# Altium footprint library Footprints.PcbLib: 266 footprints (part 9 of 17)
Each footprint in its own frame and in the unit in brackets; x right, y up, seen from the top. Pads: shape width x height; smd on the part's side, far side on the other; paste and mask are expansions set on the pad; w line width, h text height; cw(c..) or ccw(c..) is an arc to the next point about the centre after c.
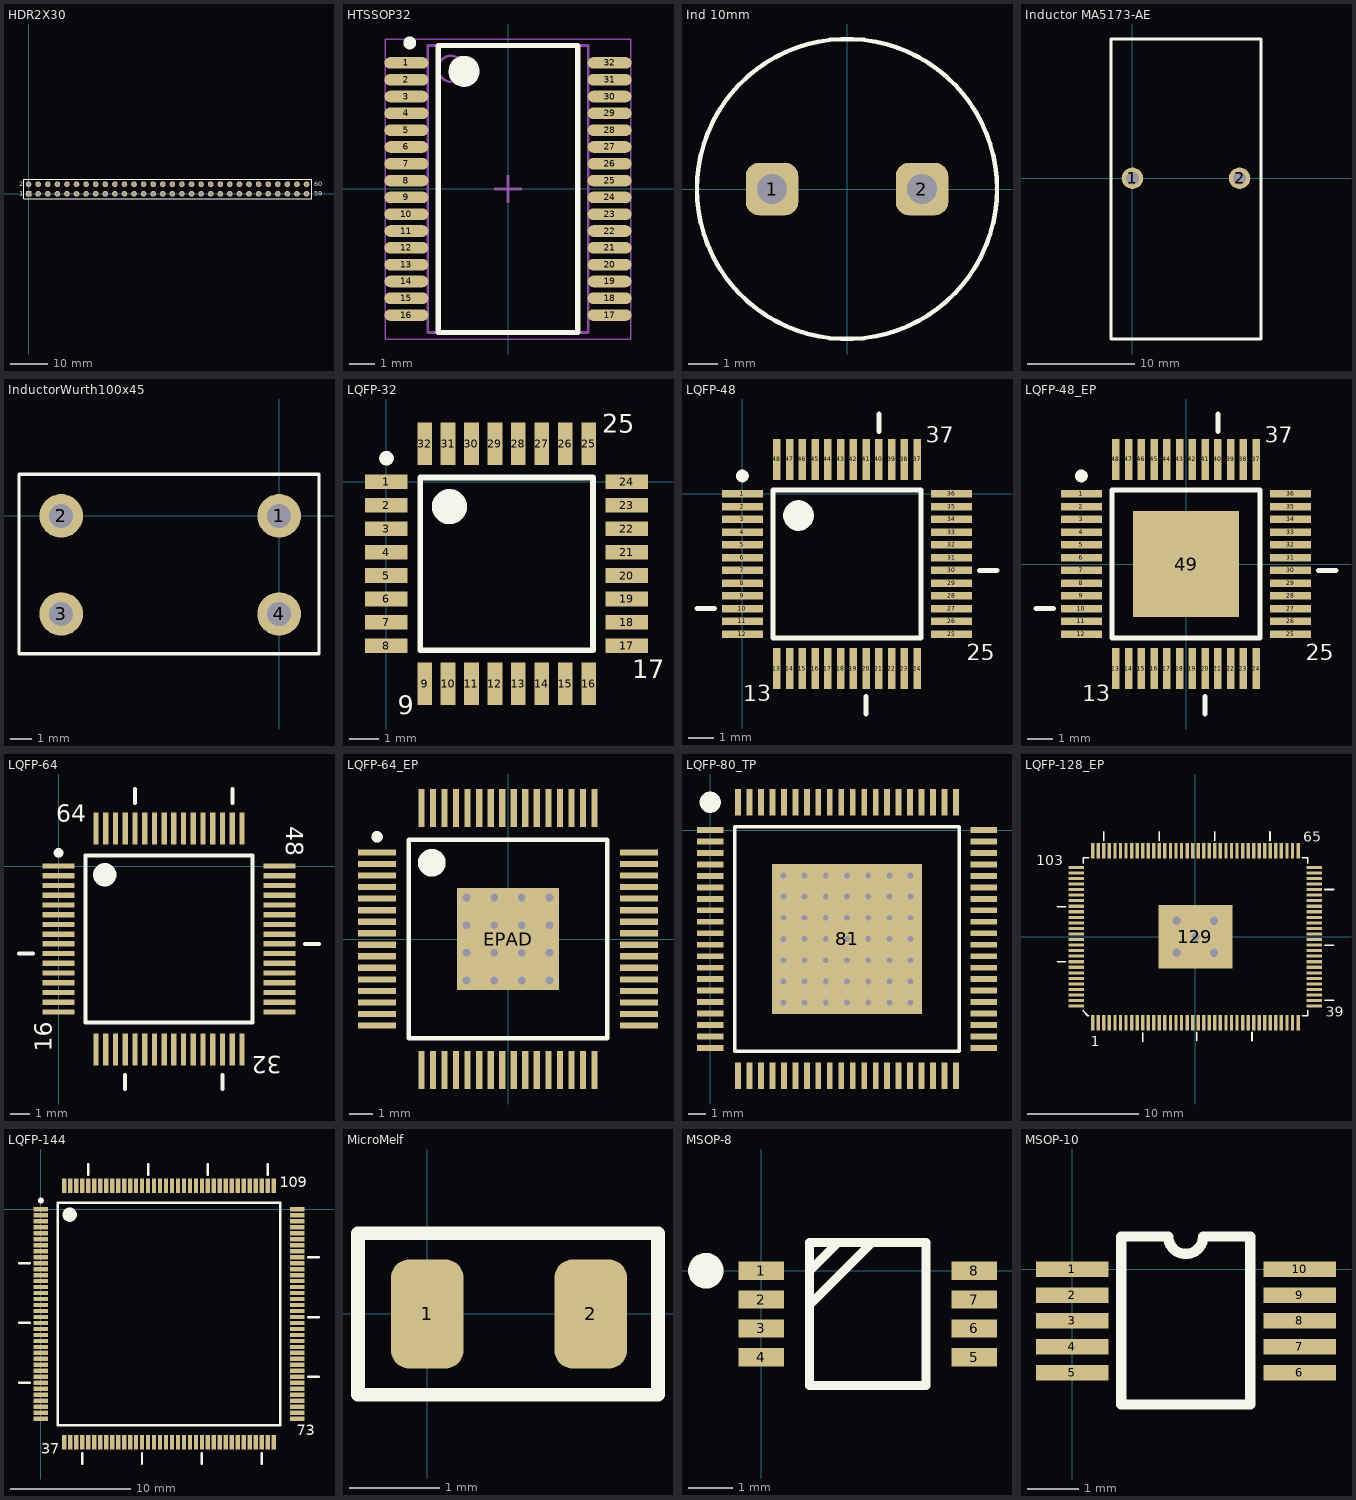
[diagram p8: the footprints below, top view; thin cyan lines are the x and y axes]

## HDR2X30 [mm] "Connector; Header; 30x2 Position"
pads (60):
  rect 1.5x1.5 hole 0.9: 1(0,0)
  round 1.5 hole 0.9: 2(0,2.54) 3(2.54,0) 4(2.54,2.54) 5(5.08,0) 6(5.08,2.54) 7(7.62,0) 8(7.62,2.54) 9(10.16,0) 10(10.16,2.54) 11(12.7,0) 12(12.7,2.54) 13(15.24,0) 14(15.24,2.54) 15(17.78,0) 16(17.78,2.54) 17(20.32,0) 18(20.32,2.54) 19(22.86,0) 20(22.86,2.54) 21(25.4,0) 22(25.4,2.54) 23(27.94,0) 24(27.94,2.54) 25(30.48,0) 26(30.48,2.54) 27(33.02,0) 28(33.02,2.54) 29(35.56,0) 30(35.56,2.54) 31(38.1,0) 32(38.1,2.54) 33(40.64,0) 34(40.64,2.54) 35(43.18,0) 36(43.18,2.54) 37(45.72,0) 38(45.72,2.54) 39(48.26,0) 40(48.26,2.54) 41(50.8,0) 42(50.8,2.54) 43(53.34,0) 44(53.34,2.54) 45(55.88,0) 46(55.88,2.54) 47(58.42,0) 48(58.42,2.54) 49(60.96,0) 50(60.96,2.54) 51(63.5,0) 52(63.5,2.54) 53(66.04,0) 54(66.04,2.54) 55(68.58,0) 56(68.58,2.54) 57(71.12,0) 58(71.12,2.54) 59(73.66,0) 60(73.66,2.54)
Top Overlay:
  lines w0.2: -1.27,-1.27 75.06,-1.27 75.06,3.81 -1.27,3.81 -1.27,-1.27
  text "60" at 75.692,2.032 h1.27
  text "59" at 75.692,-0.508 h1.27
  text "1" at -2.54,-0.508 h1.27
  text "2" at -2.54,2.032 h1.27
Bottom Overlay:
  text "1" at -55.88,-0.508 h1.27

## HTSSOP32 [mm] "TSOP, 32-Leads, Body 11,00x6,10mm, Pitch 0,65mm, IPC Medium Density"
height 1.1
pads (32):
  oval 1.7x0.45 smd: 1(-3.927,4.875) 2(-3.927,4.225) 3(-3.927,3.575) 4(-3.927,2.925) 5(-3.927,2.275) 6(-3.927,1.625) 7(-3.927,0.975) 8(-3.927,0.325) 9(-3.927,-0.325) 10(-3.927,-0.975) 11(-3.927,-1.625) 12(-3.927,-2.275) 13(-3.927,-2.925) 14(-3.927,-3.575) 15(-3.927,-4.225) 16(-3.927,-4.875) 17(3.927,-4.875) 18(3.927,-4.225) 19(3.927,-3.575) 20(3.927,-2.925) 21(3.927,-2.275) 22(3.927,-1.625) 23(3.927,-0.975) 24(3.927,-0.325) 25(3.927,0.325) 26(3.927,0.975) 27(3.927,1.625) 28(3.927,2.275) 29(3.927,2.925) 30(3.927,3.575) 31(3.927,4.225) 32(3.927,4.875)
Top Overlay:
  circle w0.6: c-1.7,4.55 r0.3
  circle w0.25: c-3.8,5.65 r0.125
  lines w0.2: -2.7,-5.55 2.7,-5.55 2.7,5.55 -2.7,5.55 -2.7,-5.55
Mechanical 13:
  circle w0.1: c-2.2,4.65 r0.5
  lines w0.1: -3.1,-5.55 3.1,-5.55 3.1,5.55 -3.1,5.55 -3.1,-5.55
Mechanical 15:
  lines w0.05: -4.75,-5.8 4.75,-5.8 4.75,5.8 -4.75,5.8 -4.75,-5.8
  lines w0.1: -0.5,0 0.5,0 ; 0,-0.5 0,0.5
3D body "HTSSOP32.step": height 1.08, standoff -0.02, extent -3.982,-5.599 4.236,5.501

## Ind 10mm [mil]
pads (2):
  rrect50% 70x70 hole 40: 1(-100,0) 2(100,0)
Top Overlay:
  circle w6: c0,0 r200
3D body "User Library-Inductor 10x12 (200 mils).STEP": height 477.56, standoff -152.36, extent -196.86,-191.54 196.84,202.16

## Inductor MA5173-AE [mm]
pads (2):
  round 2 hole 1.2: 1(0,0) 2(10,0)
Top Overlay:
  lines w0.254: -2,-2 -2,13 12,13 12,-15 -2,-15 -2,0
3D body "Coilcraft-MA5173-AE.STEP": height 28.6, standoff -12, extent -1.15,-14.3 11.15,14.3

## InductorWurth100x45 [mm]
pads (4):
  round 2 hole 1.1: 1(0,0) 2(-10,0) 3(-10,-4.5) 4(0,-4.5)
Top Overlay:
  lines w0.152: -11.938,-6.325 1.829,-6.325 1.829,1.905 -11.938,1.905 -11.938,-6.325
3D body "Download_STP_7448014501.stp": height 14.6, standoff -2.5, extent -11.555,-5.985 1.445,1.515

## LQFP-32 [mm] "TQFP, 32-Leads, Body 9,1x9,1mm (max), Pitch 0,80mm, IPC Medium Density"
height 1.6
pads (32):
  rect 1.45x0.5 smd: 1(0,0) 2(0,-0.8) 3(0,-1.6) 4(0,-2.4) 5(0,-3.2) 6(0,-4) 7(0,-4.8) 8(0,-5.6) 17(8.2,-5.6) 18(8.2,-4.8) 19(8.2,-4) 20(8.2,-3.2) 21(8.2,-2.4) 22(8.2,-1.6) 23(8.2,-0.8) 24(8.2,0)
  rect 0.5x1.45 smd: 9(1.3,-6.9) 10(2.1,-6.9) 11(2.9,-6.9) 12(3.7,-6.9) 13(4.5,-6.9) 14(5.3,-6.9) 15(6.1,-6.9) 16(6.9,-6.9) 25(6.9,1.3) 26(6.1,1.3) 27(5.3,1.3) 28(4.5,1.3) 29(3.7,1.3) 30(2.9,1.3) 31(2.1,1.3) 32(1.3,1.3)
Top Overlay:
  circle w0.25: c0,0.8 r0.125
  circle w0.6: c2.15,-0.85 r0.3
  lines w0.2: 1.15,-5.75 1.15,0.15 7.05,0.15 7.05,-5.75 1.15,-5.75
  text "9" at 0.381,-7.925 h0.64
  text "17" at 8.382,-6.706 h0.64
  text "25" at 7.366,1.676 h0.64
3D body "User Library-lqfp32-1.STEP": height 1.5, standoff 0.02, extent -0.406,-7.294 8.594,1.706

## LQFP-48 [mm] "LQFP, 48-Leads, Body 9,3x9,3mm (max), Pitch 0,50mm, IPC Medium Density"
height 1.4
pads (48):
  rect 1.6x0.3 smd: 1(0,0) 2(0,-0.5) 3(0,-1) 4(0,-1.5) 5(0,-2) 6(0,-2.5) 7(0,-3) 8(0,-3.5) 9(0,-4) 10(0,-4.5) 11(0,-5) 12(0,-5.5) 25(8.2,-5.5) 26(8.2,-5) 27(8.2,-4.5) 28(8.2,-4) 29(8.2,-3.5) 30(8.2,-3) 31(8.2,-2.5) 32(8.2,-2) 33(8.2,-1.5) 34(8.2,-1) 35(8.2,-0.5) 36(8.2,0)
  rect 0.3x1.6 smd: 13(1.35,-6.85) 14(1.85,-6.85) 15(2.35,-6.85) 16(2.85,-6.85) 17(3.35,-6.85) 18(3.85,-6.85) 19(4.35,-6.85) 20(4.85,-6.85) 21(5.35,-6.85) 22(5.85,-6.85) 23(6.35,-6.85) 24(6.85,-6.85) 37(6.85,1.35) 38(6.35,1.35) 39(5.85,1.35) 40(5.35,1.35) 41(4.85,1.35) 42(4.35,1.35) 43(3.85,1.35) 44(3.35,1.35) 45(2.85,1.35) 46(2.35,1.35) 47(1.85,1.35) 48(1.35,1.35)
Top Overlay:
  circle w0.6: c2.2,-0.85 r0.3
  circle w0.25: c0,0.7 r0.125
  lines w0.2: 1.2,-5.65 7,-5.65 7,0.15 1.2,0.15 1.2,-5.65
  lines w0.203: -1.778,-4.496 -1.092,-4.496 ; 4.846,-8.628 4.846,-7.942 ; 5.354,2.442 5.354,3.128 ; 9.292,-3.004 9.978,-3.004
  text "13" at 0.025,-8.128 h0.64
  text "25" at 8.788,-6.528 h0.64
  text "37" at 7.188,2.007 h0.64
3D body "SW3dPS-LQFP48.STEP": height 1.5, standoff 0, extent -0.389,-7.243 8.611,1.757

## LQFP-48_EP [mm] "LQFP, 48-Leads, Body 9,3x9,3mm (max), Pitch 0,50mm, IPC Medium Density"
height 1.4
pads (49):
  rect 1.6x0.3 smd: 1(-4.1,2.75) 2(-4.1,2.25) 3(-4.1,1.75) 4(-4.1,1.25) 5(-4.1,0.75) 6(-4.1,0.25) 7(-4.1,-0.25) 8(-4.1,-0.75) 9(-4.1,-1.25) 10(-4.1,-1.75) 11(-4.1,-2.25) 12(-4.1,-2.75) 25(4.1,-2.75) 26(4.1,-2.25) 27(4.1,-1.75) 28(4.1,-1.25) 29(4.1,-0.75) 30(4.1,-0.25) 31(4.1,0.25) 32(4.1,0.75) 33(4.1,1.25) 34(4.1,1.75) 35(4.1,2.25) 36(4.1,2.75)
  rect 0.3x1.6 smd: 13(-2.75,-4.1) 14(-2.25,-4.1) 15(-1.75,-4.1) 16(-1.25,-4.1) 17(-0.75,-4.1) 18(-0.25,-4.1) 19(0.25,-4.1) 20(0.75,-4.1) 21(1.25,-4.1) 22(1.75,-4.1) 23(2.25,-4.1) 24(2.75,-4.1) 37(2.75,4.1) 38(2.25,4.1) 39(1.75,4.1) 40(1.25,4.1) 41(0.75,4.1) 42(0.25,4.1) 43(-0.25,4.1) 44(-0.75,4.1) 45(-1.25,4.1) 46(-1.75,4.1) 47(-2.25,4.1) 48(-2.75,4.1)
  rect 4.15x4.15 smd paste-1000: 49(0,0)
Top Overlay:
  circle w0.25: c-4.1,3.45 r0.125
  lines w0.2: -2.9,-2.9 -2.9,2.9 2.9,2.9 2.9,-2.9 -2.9,-2.9
  lines w0.203: -5.878,-1.746 -5.192,-1.746 ; 0.746,-5.878 0.746,-5.192 ; 1.254,5.192 1.254,5.878 ; 5.192,-0.254 5.878,-0.254
  text "37" at 3.088,4.757 h0.64
  text "25" at 4.688,-3.778 h0.64
  text "13" at -4.075,-5.378 h0.64
Top Paste:
  circle w0.2: c-1.722,1.524 r0.1
  circle w0.2: c-1.037,1.524 r0.1
  circle w0.2: c-0.352,1.524 r0.1
  circle w0.2: c0.333,1.524 r0.1
  circle w0.2: c1.018,1.524 r0.1
  circle w0.2: c1.703,1.524 r0.1
  circle w0.2: c-1.722,0.925 r0.1
  circle w0.2: c-1.037,0.925 r0.1
  circle w0.2: c-0.352,0.925 r0.1
  circle w0.2: c0.333,0.925 r0.1
  circle w0.2: c1.018,0.925 r0.1
  circle w0.2: c1.703,0.925 r0.1
  circle w0.2: c-1.722,0.325 r0.1
  circle w0.2: c-1.037,0.325 r0.1
  circle w0.2: c-0.352,0.325 r0.1
  circle w0.2: c0.333,0.325 r0.1
  circle w0.2: c1.018,0.325 r0.1
  circle w0.2: c1.703,0.325 r0.1
  circle w0.2: c-1.722,-0.274 r0.1
  circle w0.2: c-1.037,-0.274 r0.1
  circle w0.2: c-0.352,-0.274 r0.1
  circle w0.2: c0.333,-0.274 r0.1
  circle w0.2: c1.018,-0.274 r0.1
  circle w0.2: c1.703,-0.274 r0.1
  circle w0.2: c1.703,-0.874 r0.1
  circle w0.2: c1.018,-0.874 r0.1
  circle w0.2: c0.333,-0.874 r0.1
  circle w0.2: c-0.352,-0.874 r0.1
  circle w0.2: c-1.037,-0.874 r0.1
  circle w0.2: c-1.722,-0.874 r0.1
  circle w0.2: c-1.722,-1.473 r0.1
  circle w0.2: c-1.037,-1.473 r0.1
  circle w0.2: c-0.352,-1.473 r0.1
  circle w0.2: c0.333,-1.473 r0.1
  circle w0.2: c1.018,-1.473 r0.1
  circle w0.2: c1.703,-1.473 r0.1
3D body "SW3dPS-LQFP48.STEP": height 1.5, standoff 0, extent -4.489,-4.493 4.511,4.507

## LQFP-64 [mm] "LQFP, 64-Leads, Body 12,2x12,2mm (max), Pitch 0,50mm, IPC Medium Density"
height 1.6
pads (64):
  rect 1.65x0.27 smd: 1(0,0) 2(0,-0.5) 3(0,-1) 4(0,-1.5) 5(0,-2) 6(0,-2.5) 7(0,-3) 8(0,-3.5) 9(0,-4) 10(0,-4.5) 11(0,-5) 12(0,-5.5) 13(0,-6) 14(0,-6.5) 15(0,-7) 16(0,-7.5) 33(11.35,-7.5) 34(11.35,-7) 35(11.35,-6.5) 36(11.35,-6) 37(11.35,-5.5) 38(11.35,-5) 39(11.35,-4.5) 40(11.35,-4) 41(11.35,-3.5) 42(11.35,-3) 43(11.35,-2.5) 44(11.35,-2) 45(11.35,-1.5) 46(11.35,-1) 47(11.35,-0.5) 48(11.35,0)
  rect 0.27x1.65 smd: 17(1.925,-9.425) 18(2.425,-9.425) 19(2.925,-9.425) 20(3.425,-9.425) 21(3.925,-9.425) 22(4.425,-9.425) 23(4.925,-9.425) 24(5.425,-9.425) 25(5.925,-9.425) 26(6.425,-9.425) 27(6.925,-9.425) 28(7.425,-9.425) 29(7.925,-9.425) 30(8.425,-9.425) 31(8.925,-9.425) 32(9.425,-9.425) 49(9.425,1.925) 50(8.925,1.925) 51(8.425,1.925) 52(7.925,1.925) 53(7.425,1.925) 54(6.925,1.925) 55(6.425,1.925) 56(5.925,1.925) 57(5.425,1.925) 58(4.925,1.925) 59(4.425,1.925) 60(3.925,1.925) 61(3.425,1.925) 62(2.925,1.925) 63(2.425,1.925) 64(1.925,1.925)
Top Overlay:
  circle w0.6: c2.375,-0.45 r0.3
  circle w0.25: c0,0.677 r0.125
  lines w0.2: 1.375,-8.05 9.975,-8.05 9.975,0.55 1.375,0.55 1.375,-8.05
  lines w0.203: -2.032,-4.496 -1.321,-4.496 ; 3.421,-11.457 3.421,-10.746 ; 3.929,3.246 3.929,3.957 ; 8.421,-11.457 8.421,-10.746 ; 8.929,3.246 8.929,3.957 ; 12.671,-4.004 13.382,-4.004
  text "64" at -0.127,2.286 h0.89
  text "48" at 11.711,2.052 h0.89
  text "32" at 11.477,-9.786 h0.89
  text "16" at -0.361,-9.552 h0.89
3D body "lqpf64.STEP": height 1.5, standoff 0.02, extent -0.325,-9.75 11.675,2.25

## LQFP-64_EP [mm] "LQFP, 64-Leads, Body 12,2x12,2mm (max), Pitch 0,50mm, IPC Medium Density"
height 1.6
pads (65):
  rect 1.65x0.27 smd: 1(-5.675,3.75) 2(-5.675,3.25) 3(-5.675,2.75) 4(-5.675,2.25) 5(-5.675,1.75) 6(-5.675,1.25) 7(-5.675,0.75) 8(-5.675,0.25) 9(-5.675,-0.25) 10(-5.675,-0.75) 11(-5.675,-1.25) 12(-5.675,-1.75) 13(-5.675,-2.25) 14(-5.675,-2.75) 15(-5.675,-3.25) 16(-5.675,-3.75) 33(5.675,-3.75) 34(5.675,-3.25) 35(5.675,-2.75) 36(5.675,-2.25) 37(5.675,-1.75) 38(5.675,-1.25) 39(5.675,-0.75) 40(5.675,-0.25) 41(5.675,0.25) 42(5.675,0.75) 43(5.675,1.25) 44(5.675,1.75) 45(5.675,2.25) 46(5.675,2.75) 47(5.675,3.25) 48(5.675,3.75)
  rect 0.27x1.65 smd: 17(-3.75,-5.675) 18(-3.25,-5.675) 19(-2.75,-5.675) 20(-2.25,-5.675) 21(-1.75,-5.675) 22(-1.25,-5.675) 23(-0.75,-5.675) 24(-0.25,-5.675) 25(0.25,-5.675) 26(0.75,-5.675) 27(1.25,-5.675) 28(1.75,-5.675) 29(2.25,-5.675) 30(2.75,-5.675) 31(3.25,-5.675) 32(3.75,-5.675) 49(3.75,5.675) 50(3.25,5.675) 51(2.75,5.675) 52(2.25,5.675) 53(1.75,5.675) 54(1.25,5.675) 55(0.75,5.675) 56(0.25,5.675) 57(-0.25,5.675) 58(-0.75,5.675) 59(-1.25,5.675) 60(-1.75,5.675) 61(-2.25,5.675) 62(-2.75,5.675) 63(-3.25,5.675) 64(-3.75,5.675)
  rect 4.4x4.4 smd paste-900: EPAD(0,0)
via 1.8,-1.8 diameter 0.66 hole 0.33
via 0.6,-1.8 diameter 0.66 hole 0.33
via -0.6,-1.8 diameter 0.66 hole 0.33
via -1.8,-1.8 diameter 0.66 hole 0.33
via 1.8,-0.6 diameter 0.66 hole 0.33
via 0.6,-0.6 diameter 0.66 hole 0.33
via -0.6,-0.6 diameter 0.66 hole 0.33
via -1.8,-0.6 diameter 0.66 hole 0.33
via 1.8,0.6 diameter 0.66 hole 0.33
via 0.6,0.6 diameter 0.66 hole 0.33
via -0.6,0.6 diameter 0.66 hole 0.33
via -1.8,0.6 diameter 0.66 hole 0.33
via 1.8,1.8 diameter 0.66 hole 0.33
via 0.6,1.8 diameter 0.66 hole 0.33
via -0.6,1.8 diameter 0.66 hole 0.33
via -1.8,1.8 diameter 0.66 hole 0.33
Top Overlay:
  circle w0.6: c-3.3,3.3 r0.3
  circle w0.25: c-5.675,4.427 r0.125
  lines w0.2: -4.3,-4.3 4.3,-4.3 4.3,4.3 -4.3,4.3 -4.3,-4.3
Top Paste:
  rectangle: -1.8,0.6 -0.6,1.8
  rectangle: -0.6,-0.6 0.6,0.6
  rectangle: 0.6,-1.8 1.8,-0.6
  rectangle: 0.6,0.6 1.8,1.8
  rectangle: -1.8,-1.8 -0.6,-0.6
3D body "lqpf64.STEP": height 1.5, standoff 0.02, extent -6,-6 6,6

## LQFP-80_TP [mm] "LQFP, 80-Leads, Body 16,3x16,3mm (max), Pitch 0,65mm, IPC Medium Density"
height 1.6
pads (81):
  rect 1.5x0.33 smd: 1(0,0) 2(0,-0.65) 3(0,-1.3) 4(0,-1.95) 5(0,-2.6) 6(0,-3.25) 7(0,-3.9) 8(0,-4.55) 9(0,-5.2) 10(0,-5.85) 11(0,-6.5) 12(0,-7.15) 13(0,-7.8) 14(0,-8.45) 15(0,-9.1) 16(0,-9.75) 17(0,-10.4) 18(0,-11.05) 19(0,-11.7) 20(0,-12.35) 41(15.5,-12.35) 42(15.5,-11.7) 43(15.5,-11.05) 44(15.5,-10.4) 45(15.5,-9.75) 46(15.5,-9.1) 47(15.5,-8.45) 48(15.5,-7.8) 49(15.5,-7.15) 50(15.5,-6.5) 51(15.5,-5.85) 52(15.5,-5.2) 53(15.5,-4.55) 54(15.5,-3.9) 55(15.5,-3.25) 56(15.5,-2.6) 57(15.5,-1.95) 58(15.5,-1.3) 59(15.5,-0.65) 60(15.5,0)
  rect 0.33x1.5 smd: 21(1.575,-13.925) 22(2.225,-13.925) 23(2.875,-13.925) 24(3.525,-13.925) 25(4.175,-13.925) 26(4.825,-13.925) 27(5.475,-13.925) 28(6.125,-13.925) 29(6.775,-13.925) 30(7.425,-13.925) 31(8.075,-13.925) 32(8.725,-13.925) 33(9.375,-13.925) 34(10.025,-13.925) 35(10.675,-13.925) 36(11.325,-13.925) 37(11.975,-13.925) 38(12.625,-13.925) 39(13.275,-13.925) 40(13.925,-13.925) 61(13.925,1.575) 62(13.275,1.575) 63(12.625,1.575) 64(11.975,1.575) 65(11.325,1.575) 66(10.675,1.575) 67(10.025,1.575) 68(9.375,1.575) 69(8.725,1.575) 70(8.075,1.575) 71(7.425,1.575) 72(6.775,1.575) 73(6.125,1.575) 74(5.475,1.575) 75(4.825,1.575) 76(4.175,1.575) 77(3.525,1.575) 78(2.875,1.575) 79(2.225,1.575) 80(1.575,1.575)
  rect 8.5x8.5 smd paste-100: 81(7.75,-6.175)
via 11.35,-9.775 diameter 0.66 hole 0.33
via 10.15,-9.775 diameter 0.66 hole 0.33
via 8.95,-9.775 diameter 0.66 hole 0.33
via 7.75,-9.775 diameter 0.66 hole 0.33
via 6.55,-9.775 diameter 0.66 hole 0.33
via 5.35,-9.775 diameter 0.66 hole 0.33
via 4.15,-9.775 diameter 0.66 hole 0.33
via 11.35,-8.575 diameter 0.66 hole 0.33
via 10.15,-8.575 diameter 0.66 hole 0.33
via 8.95,-8.575 diameter 0.66 hole 0.33
via 7.75,-8.575 diameter 0.66 hole 0.33
via 6.55,-8.575 diameter 0.66 hole 0.33
via 5.35,-8.575 diameter 0.66 hole 0.33
via 4.15,-8.575 diameter 0.66 hole 0.33
via 11.35,-7.375 diameter 0.66 hole 0.33
via 10.15,-7.375 diameter 0.66 hole 0.33
via 8.95,-7.375 diameter 0.66 hole 0.33
via 7.75,-7.375 diameter 0.66 hole 0.33
via 6.55,-7.375 diameter 0.66 hole 0.33
via 5.35,-7.375 diameter 0.66 hole 0.33
via 4.15,-7.375 diameter 0.66 hole 0.33
via 11.35,-6.175 diameter 0.66 hole 0.33
via 10.15,-6.175 diameter 0.66 hole 0.33
via 8.95,-6.175 diameter 0.66 hole 0.33
via 7.75,-6.175 diameter 0.66 hole 0.33
via 6.55,-6.175 diameter 0.66 hole 0.33
via 5.35,-6.175 diameter 0.66 hole 0.33
via 4.15,-6.175 diameter 0.66 hole 0.33
via 11.35,-4.975 diameter 0.66 hole 0.33
via 10.15,-4.975 diameter 0.66 hole 0.33
via 8.95,-4.975 diameter 0.66 hole 0.33
via 7.75,-4.975 diameter 0.66 hole 0.33
via 6.55,-4.975 diameter 0.66 hole 0.33
via 5.35,-4.975 diameter 0.66 hole 0.33
via 4.15,-4.975 diameter 0.66 hole 0.33
via 11.35,-3.775 diameter 0.66 hole 0.33
via 10.15,-3.775 diameter 0.66 hole 0.33
via 8.95,-3.775 diameter 0.66 hole 0.33
via 7.75,-3.775 diameter 0.66 hole 0.33
via 6.55,-3.775 diameter 0.66 hole 0.33
via 5.35,-3.775 diameter 0.66 hole 0.33
via 4.15,-3.775 diameter 0.66 hole 0.33
via 11.35,-2.575 diameter 0.66 hole 0.33
via 10.15,-2.575 diameter 0.66 hole 0.33
via 8.95,-2.575 diameter 0.66 hole 0.33
via 7.75,-2.575 diameter 0.66 hole 0.33
via 6.55,-2.575 diameter 0.66 hole 0.33
via 5.35,-2.575 diameter 0.66 hole 0.33
via 4.15,-2.575 diameter 0.66 hole 0.33
Top Overlay:
  circle w0.6: c0,1.575 r0.3
  lines w0.2: 1.4,-12.525 14.1,-12.525 14.1,0.175 1.4,0.175 1.4,-12.525
Top Paste:
  rectangle: 8.95,-9.775 11.35,-7.375
  rectangle: 4.15,-9.775 6.55,-7.375
  rectangle: 6.55,-7.375 8.95,-4.975
  rectangle: 8.95,-4.975 11.35,-2.575
  rectangle: 4.15,-4.975 6.55,-2.575
3D body "LQFP-80 14x14.STEP": height 1.6, standoff 0.01, extent -0.254,-14.177 15.755,1.832

## LQFP-128_EP [mil]
height 62.99
pads (129):
  rect 12x55 smd: 1(-364.5,-304.5) 2(-344.8,-304.5) 3(-325.1,-304.5) 4(-305.4,-304.5) 5(-285.7,-304.5) 6(-266,-304.5) 7(-246.3,-304.5) 8(-226.6,-304.5) 9(-206.9,-304.5) 10(-187.2,-304.5) 11(-167.5,-304.5) 12(-147.8,-304.5) 13(-128.1,-304.5) 14(-108.4,-304.5) 15(-88.7,-304.5) 16(-69,-304.5) 17(-49.3,-304.5) 18(-29.6,-304.5) 19(-9.9,-304.5) 20(9.8,-304.5) 21(29.5,-304.5) 22(49.2,-304.5) 23(68.9,-304.5) 24(88.6,-304.5) 25(108.3,-304.5) 26(128,-304.5) 27(147.7,-304.5) 28(167.4,-304.5) 29(187.1,-304.5) 30(206.8,-304.5) 31(226.5,-304.5) 32(246.2,-304.5) 33(265.9,-304.5) 34(285.6,-304.5) 35(305.3,-304.5) 36(325,-304.5) 37(344.7,-304.5) 38(364.4,-304.5) 65(364.4,304.5) 66(344.7,304.5) 67(325,304.5) 68(305.3,304.5) 69(285.6,304.5) 70(265.9,304.5) 71(246.2,304.5) 72(226.5,304.5) 73(206.8,304.5) 74(187.1,304.5) 75(167.4,304.5) 76(147.7,304.5) 77(128,304.5) 78(108.3,304.5) 79(88.6,304.5) 80(68.9,304.5) 81(49.2,304.5) 82(29.5,304.5) 83(9.8,304.5) 84(-9.9,304.5) 85(-29.6,304.5) 86(-49.3,304.5) 87(-69,304.5) 88(-88.7,304.5) 89(-108.4,304.5) 90(-128.1,304.5) 91(-147.8,304.5) 92(-167.5,304.5) 93(-187.2,304.5) 94(-206.9,304.5) 95(-226.6,304.5) 96(-246.3,304.5) 97(-266,304.5) 98(-285.7,304.5) 99(-305.4,304.5) 100(-325.1,304.5) 101(-344.8,304.5) 102(-364.5,304.5)
  rect 55x11 smd: 39(422.5,-246.3) 40(422.5,-226.6) 41(422.5,-206.9) 42(422.5,-187.2) 43(422.5,-167.5) 44(422.5,-147.8) 45(422.5,-128.1) 46(422.5,-108.4) 47(422.5,-88.7) 48(422.5,-69) 49(422.5,-49.3) 50(422.5,-29.6) 51(422.5,-9.9) 52(422.5,9.8) 53(422.5,29.5) 54(422.5,49.2) 55(422.5,68.9) 56(422.5,88.6) 57(422.5,108.3) 58(422.5,128) 59(422.5,147.7) 60(422.5,167.4) 61(422.5,187.1) 62(422.5,206.8) 63(422.5,226.5) 64(422.5,246.2) 103(-422.5,246.2) 104(-422.5,226.5) 105(-422.5,206.8) 106(-422.5,187.1) 107(-422.5,167.4) 108(-422.5,147.7) 109(-422.5,128) 110(-422.5,108.3) 111(-422.5,88.6) 112(-422.5,68.9) 113(-422.5,49.2) 114(-422.5,29.5) 115(-422.5,9.8) 116(-422.5,-9.9) 117(-422.5,-29.6) 118(-422.5,-49.3) 119(-422.5,-69) 120(-422.5,-88.7) 121(-422.5,-108.4) 122(-422.5,-128.1) 123(-422.5,-147.8) 124(-422.5,-167.5) 125(-422.5,-187.2) 126(-422.5,-206.9) 127(-422.5,-226.6) 128(-422.5,-246.3)
  rect 264x226 smd paste-39370.1: 129(0,0)
via 0,0 diameter 39.37 hole 29.53
via -66,-56.5 diameter 39.37 hole 29.53
via -66,56.5 diameter 39.37 hole 29.53
via 66,-56.5 diameter 39.37 hole 29.53
via 66,56.5 diameter 39.37 hole 29.53
Top Overlay:
  lines w6: -491,-89 -461,-89 ; -490,107 -460,107 ; -398.7,-261 -398.7,-263.5 -381.7,-280.5 -379,-280.5 ; -398.7,261 -398.7,280.5 -379,280.5 ; -325,342 -325,372 ; -187,-372 -187,-342 ; -128,342 -128,372 ; 5,-369.76 5,-339.76 ; 69,342 69,372 ; 201,-368.76 201,-338.76 ; 265,342 265,372 ; 379,-280.5 398.7,-280.5 398.7,-261 ; 379,280.5 398.7,280.5 398.7,261 ; 460,-225 490,-225 ; 460,168 490,168 ; 460.1,-29.9 490.1,-29.9
  text "103" at -566,253 h36
  text "65" at 382,337 h36
  text "39" at 463,-284 h36
  text "1" at -372,-389 h36
Top Paste:
  region: -130,-5 -130,-110 -5,-110 -5,-5
  region: 5,-5 5,-110 130,-110 130,-5
  region: -130,5 -130,110 -5,110 -5,5
  region: 5,110 5,5 130,5 130,110
3D body "User Library-LQFP-144-1.STEP": height 62.99, standoff 1.98, extent -433,-315 441.6,323.28

## LQFP-144 [mm] "TSQFP, 144-Leads, Body 22,2x22,2mm (max), Pitch 0,50mm, IPC Medium Density"
height 1.6
pads (144):
  rect 1.2x0.36 smd: 1(0,0) 2(0,-0.5) 3(0,-1) 4(0,-1.5) 5(0,-2) 6(0,-2.5) 7(0,-3) 8(0,-3.5) 9(0,-4) 10(0,-4.5) 11(0,-5) 12(0,-5.5) 13(0,-6) 14(0,-6.5) 15(0,-7) 16(0,-7.5) 17(0,-8) 18(0,-8.5) 19(0,-9) 20(0,-9.5) 21(0,-10) 22(0,-10.5) 23(0,-11) 24(0,-11.5) 25(0,-12) 26(0,-12.5) 27(0,-13) 28(0,-13.5) 29(0,-14) 30(0,-14.5) 31(0,-15) 32(0,-15.5) 33(0,-16) 34(0,-16.5) 35(0,-17) 36(0,-17.5) 73(21.41,-17.5) 74(21.41,-17) 75(21.41,-16.5) 76(21.41,-16) 77(21.41,-15.5) 78(21.41,-15) 79(21.41,-14.5) 80(21.41,-14) 81(21.41,-13.5) 82(21.41,-13) 83(21.41,-12.5) 84(21.41,-12) 85(21.41,-11.5) 86(21.41,-11) 87(21.41,-10.5) 88(21.41,-10) 89(21.41,-9.5) 90(21.41,-9) 91(21.41,-8.5) 92(21.41,-8) 93(21.41,-7.5) 94(21.41,-7) 95(21.41,-6.5) 96(21.41,-6) 97(21.41,-5.5) 98(21.41,-5) 99(21.41,-4.5) 100(21.41,-4) 101(21.41,-3.5) 102(21.41,-3) 103(21.41,-2.5) 104(21.41,-2) 105(21.41,-1.5) 106(21.41,-1) 107(21.41,-0.5) 108(21.41,0)
  rect 0.36x1.2 smd: 37(1.955,-19.455) 38(2.455,-19.455) 39(2.955,-19.455) 40(3.455,-19.455) 41(3.955,-19.455) 42(4.455,-19.455) 43(4.955,-19.455) 44(5.455,-19.455) 45(5.955,-19.455) 46(6.455,-19.455) 47(6.955,-19.455) 48(7.455,-19.455) 49(7.955,-19.455) 50(8.455,-19.455) 51(8.955,-19.455) 52(9.455,-19.455) 53(9.955,-19.455) 54(10.455,-19.455) 55(10.955,-19.455) 56(11.455,-19.455) 57(11.955,-19.455) 58(12.455,-19.455) 59(12.955,-19.455) 60(13.455,-19.455) 61(13.955,-19.455) 62(14.455,-19.455) 63(14.955,-19.455) 64(15.455,-19.455) 65(15.955,-19.455) 66(16.455,-19.455) 67(16.955,-19.455) 68(17.455,-19.455) 69(17.955,-19.455) 70(18.455,-19.455) 71(18.955,-19.455) 72(19.455,-19.455) 109(19.455,1.955) 110(18.955,1.955) 111(18.455,1.955) 112(17.955,1.955) 113(17.455,1.955) 114(16.955,1.955) 115(16.455,1.955) 116(15.955,1.955) 117(15.455,1.955) 118(14.955,1.955) 119(14.455,1.955) 120(13.955,1.955) 121(13.455,1.955) 122(12.955,1.955) 123(12.455,1.955) 124(11.955,1.955) 125(11.455,1.955) 126(10.955,1.955) 127(10.455,1.955) 128(9.955,1.955) 129(9.455,1.955) 130(8.955,1.955) 131(8.455,1.955) 132(7.955,1.955) 133(7.455,1.955) 134(6.955,1.955) 135(6.455,1.955) 136(5.955,1.955) 137(5.455,1.955) 138(4.955,1.955) 139(4.455,1.955) 140(3.955,1.955) 141(3.455,1.955) 142(2.955,1.955) 143(2.455,1.955) 144(1.955,1.955)
Top Overlay:
  circle w0.25: c0,0.73 r0.125
  circle w0.6: c2.405,-0.45 r0.3
  lines w0.2: 1.405,-18.05 1.405,0.55 20.005,0.55 20.005,-18.05 1.405,-18.05
  lines w0.203: -1.829,-14.496 -0.94,-14.496 ; -1.829,-9.496 -0.94,-9.496 ; -1.829,-4.496 -0.94,-4.496 ; 3.451,-21.284 3.451,-20.395 ; 3.959,2.895 3.959,3.784 ; 8.451,-21.284 8.451,-20.395 ; 8.959,2.895 8.959,3.784 ; 13.451,-21.284 13.451,-20.395 ; 13.959,2.895 13.959,3.784 ; 18.451,-21.284 18.451,-20.395 ; 18.959,2.895 18.959,3.784 ; 22.35,-14.004 23.239,-14.004 ; 22.35,-9.004 23.239,-9.004 ; 22.35,-4.004 23.239,-4.004
  text "37" at 0.025,-20.447 h0.89
  text "73" at 21.361,-18.898 h0.89
  text "109" at 19.964,1.854 h0.89
3D body "SW3dPS-LQFP-144.STEP": height 1.69, standoff -0.01, extent -0.293,-19.754 21.71,2.248

## MicroMelf [mm]
pads (2):
  rrect50% 0.8x1.2 smd: 1(0,0) 2(1.8,0)
Top Overlay:
  lines w0.152: -0.762,-0.889 -0.762,0.889 -0.381,0.889 2.54,0.889 2.54,-0.889 -0.762,-0.889
3D body "User Library-MicroMelf.step": height 1.13, standoff -0.01, extent -0.076,-0.508 1.854,0.635

## MSOP-8 [mm]
pads (8):
  rect 1.02x0.41 smd: 1(0,0) 2(0,-0.65) 3(0,-1.3) 4(0,-1.95) 5(4.8,-1.95) 6(4.8,-1.3) 7(4.8,-0.65) 8(4.8,0)
Top Overlay:
  circle w0.4: c-1.25,0 r0.2
  lines w0.203: 1.089,-0.762 2.486,0.635 ; 1.114,0.025 1.724,0.635 ; 1.089,-2.585 1.089,0.635 3.708,0.635 3.708,-2.585 1.089,-2.585
3D body "User Library-EMSOP-8 Natl Semi MUY08A.STEP": height 1.09, standoff -0.01, extent -0.112,-2.492 4.888,0.508

## MSOP-10 [mm]
pads (10):
  rect 1.4x0.3 smd: 1(0,0) 2(0,-0.5) 3(0,-1) 4(0,-1.5) 5(0,-2) 6(4.4,-2) 7(4.4,-1.5) 8(4.4,-1) 9(4.4,-0.5) 10(4.4,0)
Top Overlay:
  lines w0.2: 0.949,0.61 0.949,-2.616 3.439,-2.616 3.439,0.61 ; 0.949,0.631 1.857,0.63 ; 1.858,0.631 ccw(c2.194,0.631) 2.531,0.631 ; 2.53,0.632 3.439,0.631
3D body "User Library-msop-10.STEP": height 1.15, standoff 0, extent -0.24,-2.492 4.66,0.508